# Altium integrated library Samtec 2,54 mm Pitch Socket Strips.IntLib: 489 symbols (part 3 of 4)
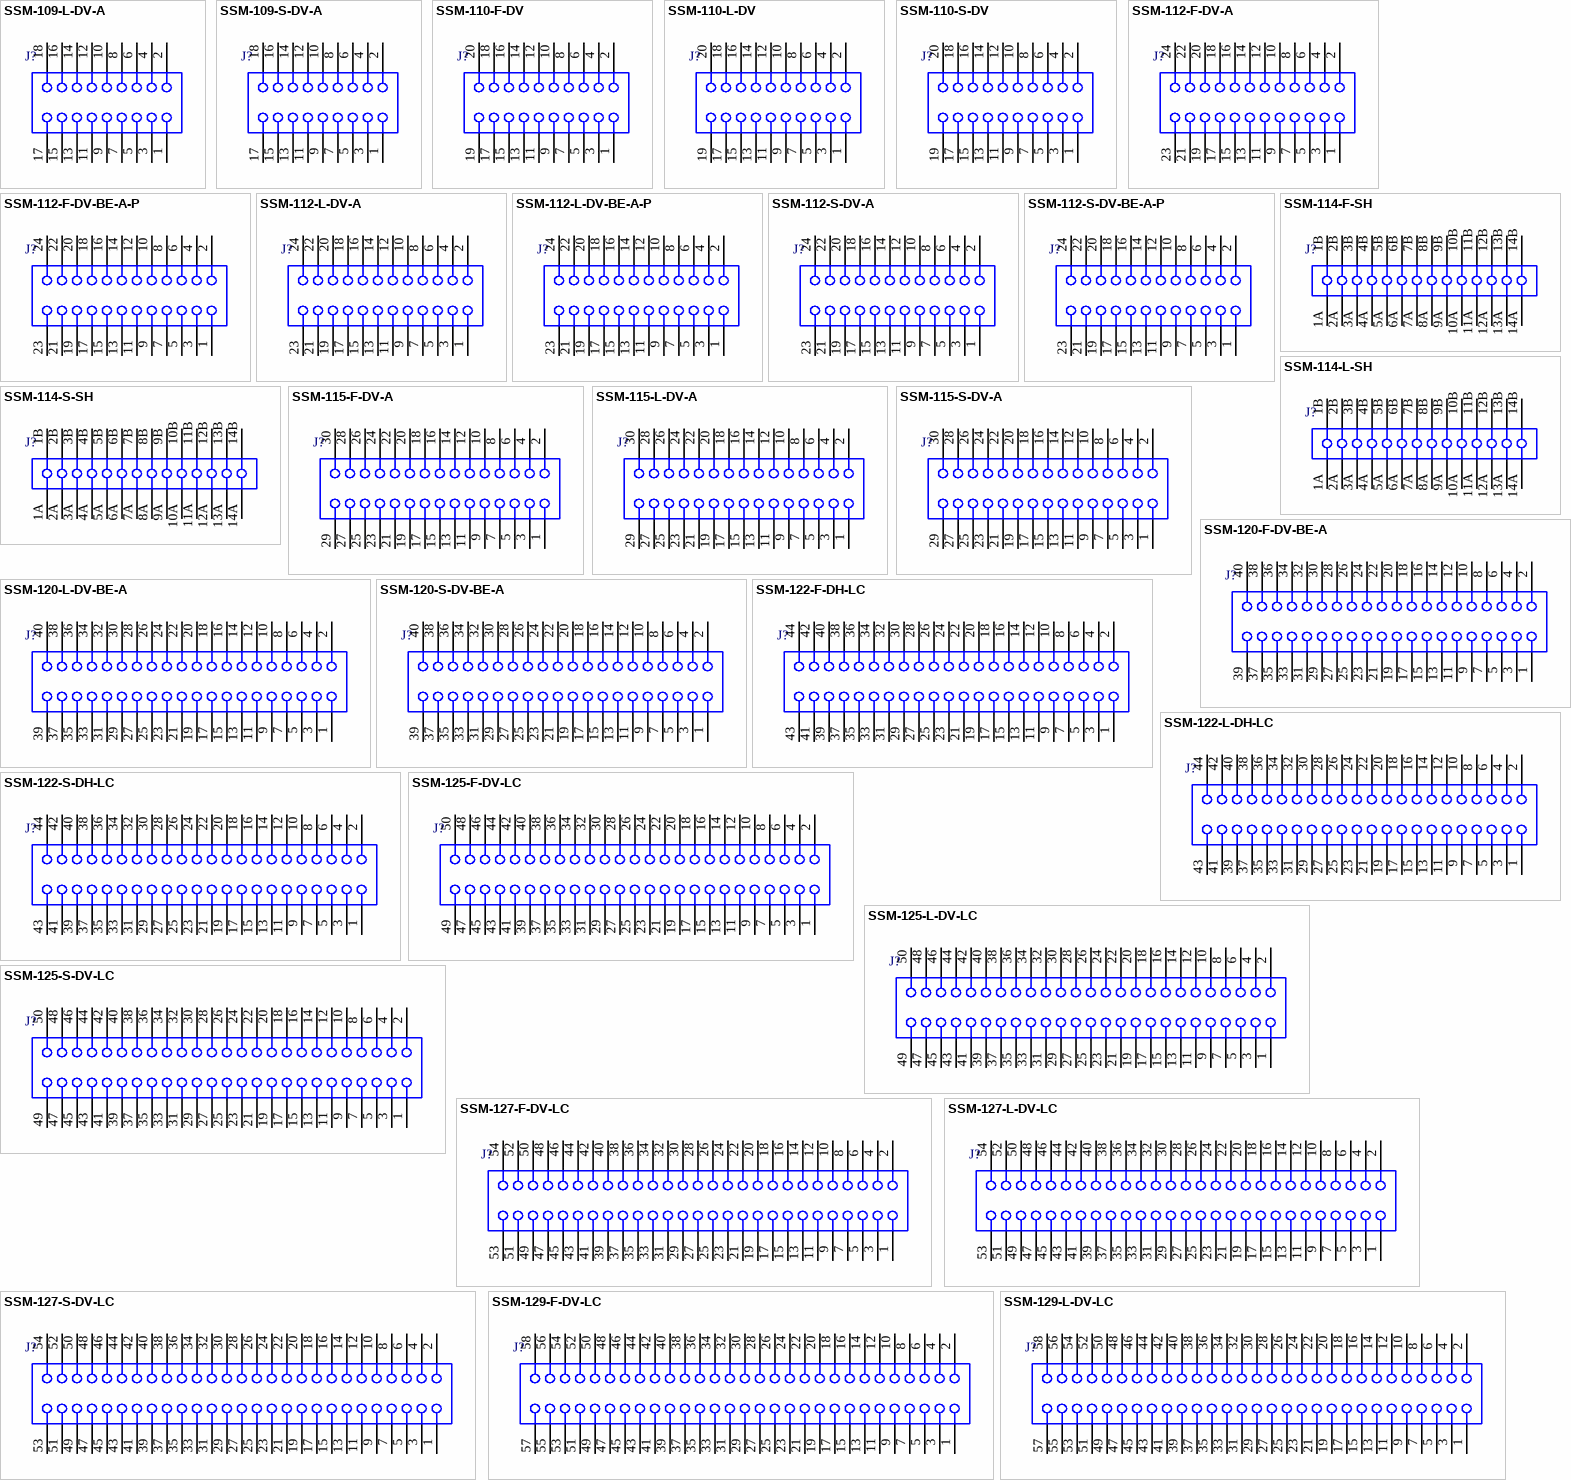
[diagram p15: symbols SSM-109-L-DV-A to SSM-129-L-DV-LC]

## SSM-129-F-DV-LC
designator J?
Tiger Claw(TM) Surface Mount Socket, Vertical, -55 to 125 degC, 2.54 mm Pitch, 58-Pin, Female, RoHS; Manufacturer: Samtec; PartNumber: SSM-129-F-DV-LC; Pitch: 2.54 mm; DatasheetVersion: F-214; PackageVersion: AK, 3/2000; PackageReference: SSM-129-X-DV-LC; PackageDescription: .100 C.L. Double Vertical SMT Socket Strip; Orientation: Vertical; RoHS: True; Temperature Range: -55 to 125 degC; Mounting Technology: Surface Mount; ComponentLink1Description: Manufacturer URL; ComponentLink1URL: http://www.samtec.com; ComponentLink2Description: Datasheet; ComponentLink2URL: http://www.samtec.com/documents/webfiles/pdf/SSM_SM.PDF; ComponentLink3Description: Package Specification; ComponentLink3URL: http://www.samtec.com/documents/webfiles/cpdf/SSM-1XX-XXX-DV-XX-XX-X-XX-MKT.pdf
footprint SMTC-SSM-129-X-DV-LC (C.L. Double Vertical SMT Socket Strip, 2x29 Pins, 2.54mm Pitch, Female)
pins: 1, 2, 3, 4, 5, 6, 7, 8, 9, 10, 11, 12, 13, 14, 15, 16, 17, 18, 19, 20, 21, 22, 23, 24, 25, 26, 27, 28, 29, 30, 31, 32, 33, 34, 35, 36, 37, 38, 39, 40, 41, 42, 43, 44, 45, 46, 47, 48, 49, 50, 51, 52, 53, 54, 55, 56, 57, 58

## SSM-129-L-DV-LC
designator J?
Tiger Claw(TM) Surface Mount Socket, Vertical, -55 to 125 degC, 2.54 mm Pitch, 58-Pin, Female, RoHS; Manufacturer: Samtec; PartNumber: SSM-129-L-DV-LC; Pitch: 2.54 mm; DatasheetVersion: F-214; PackageVersion: AK, 3/2000; PackageReference: SSM-129-X-DV-LC; PackageDescription: .100 C.L. Double Vertical SMT Socket Strip; Orientation: Vertical; RoHS: True; Temperature Range: -55 to 125 degC; Mounting Technology: Surface Mount; ComponentLink1Description: Manufacturer URL; ComponentLink1URL: http://www.samtec.com; ComponentLink2Description: Datasheet; ComponentLink2URL: http://www.samtec.com/documents/webfiles/pdf/SSM_SM.PDF; ComponentLink3Description: Package Specification; ComponentLink3URL: http://www.samtec.com/documents/webfiles/cpdf/SSM-1XX-XXX-DV-XX-XX-X-XX-MKT.pdf
footprint SMTC-SSM-129-X-DV-LC (C.L. Double Vertical SMT Socket Strip, 2x29 Pins, 2.54mm Pitch, Female)
pins: 1, 2, 3, 4, 5, 6, 7, 8, 9, 10, 11, 12, 13, 14, 15, 16, 17, 18, 19, 20, 21, 22, 23, 24, 25, 26, 27, 28, 29, 30, 31, 32, 33, 34, 35, 36, 37, 38, 39, 40, 41, 42, 43, 44, 45, 46, 47, 48, 49, 50, 51, 52, 53, 54, 55, 56, 57, 58

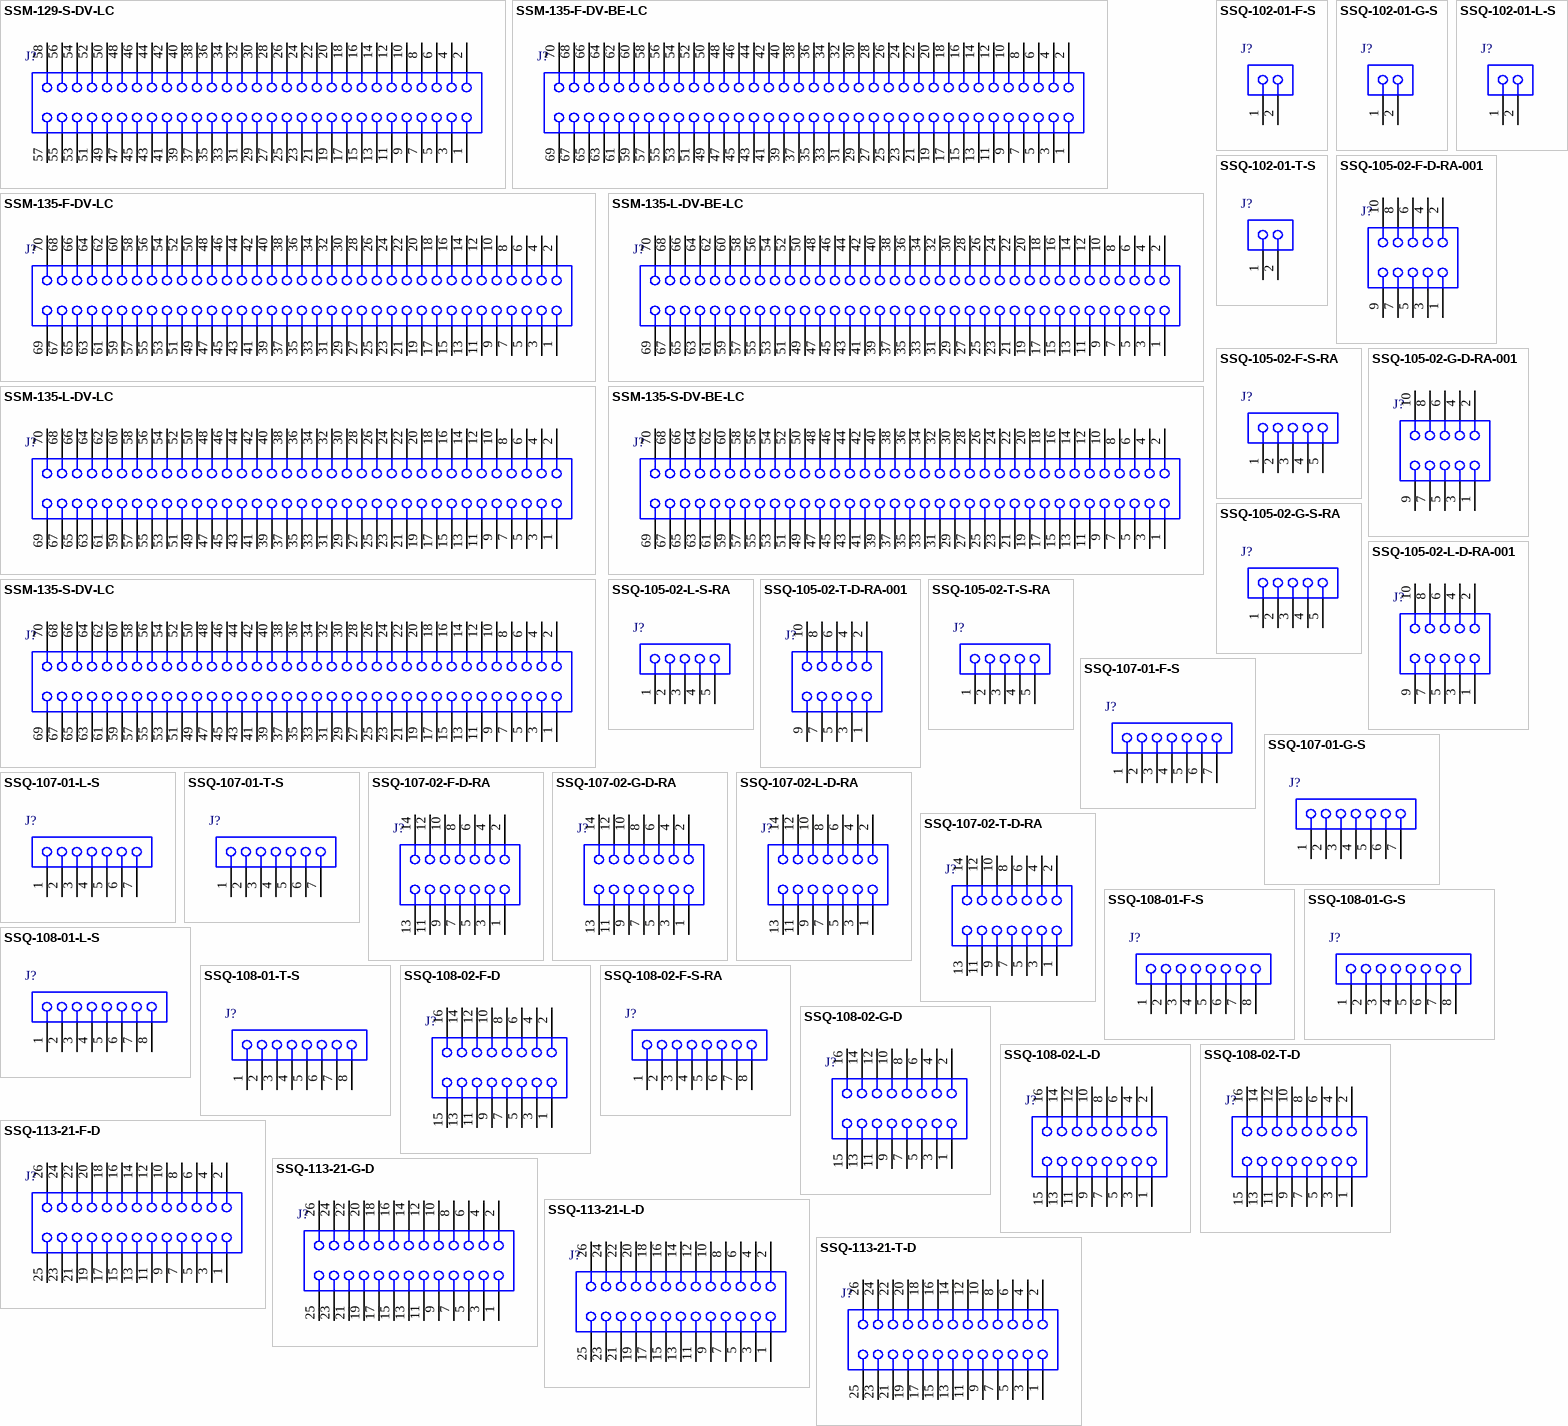
[diagram p7: symbols SSM-129-S-DV-LC to SSQ-113-21-T-D]

## SSM-129-S-DV-LC
designator J?
Tiger Claw(TM) Surface Mount Socket, Vertical, -55 to 125 degC, 2.54 mm Pitch, 58-Pin, Female, RoHS; Manufacturer: Samtec; PartNumber: SSM-129-S-DV-LC; Pitch: 2.54 mm; DatasheetVersion: F-214; PackageVersion: AK, 3/2000; PackageReference: SSM-129-X-DV-LC; PackageDescription: .100 C.L. Double Vertical SMT Socket Strip; Orientation: Vertical; RoHS: True; Temperature Range: -55 to 125 degC; Mounting Technology: Surface Mount; ComponentLink1Description: Manufacturer URL; ComponentLink1URL: http://www.samtec.com; ComponentLink2Description: Datasheet; ComponentLink2URL: http://www.samtec.com/documents/webfiles/pdf/SSM_SM.PDF; ComponentLink3Description: Package Specification; ComponentLink3URL: http://www.samtec.com/documents/webfiles/cpdf/SSM-1XX-XXX-DV-XX-XX-X-XX-MKT.pdf
footprint SMTC-SSM-129-X-DV-LC (C.L. Double Vertical SMT Socket Strip, 2x29 Pins, 2.54mm Pitch, Female)
pins: 1, 2, 3, 4, 5, 6, 7, 8, 9, 10, 11, 12, 13, 14, 15, 16, 17, 18, 19, 20, 21, 22, 23, 24, 25, 26, 27, 28, 29, 30, 31, 32, 33, 34, 35, 36, 37, 38, 39, 40, 41, 42, 43, 44, 45, 46, 47, 48, 49, 50, 51, 52, 53, 54, 55, 56, 57, 58

## SSM-135-F-DV-BE-LC
designator J?
Tiger Claw(TM) Surface Mount Socket, Vertical, -55 to 125 degC, 2.54 mm Pitch, 70-Pin, Female, RoHS; Manufacturer: Samtec; PartNumber: SSM-135-F-DV-BE-LC; Pitch: 2.54 mm; DatasheetVersion: F-214; PackageVersion: AK, 3/2000; PackageReference: SSM-135-X-DV-BE-LC; PackageDescription: .100 C.L. Double Vertical SMT Socket Strip; Orientation: Vertical; RoHS: True; Temperature Range: -55 to 125 degC; Mounting Technology: Surface Mount; ComponentLink1Description: Manufacturer URL; ComponentLink1URL: http://www.samtec.com; ComponentLink2Description: Datasheet; ComponentLink2URL: http://www.samtec.com/documents/webfiles/pdf/SSM_SM.PDF; ComponentLink3Description: Package Specification; ComponentLink3URL: http://www.samtec.com/documents/webfiles/cpdf/SSM-1XX-XXX-DV-XX-XX-X-XX-MKT.pdf
footprint SMTC-SSM-135-X-DV-BE-LC (C.L. Double Vertical SMT Socket Strip, 2x35 Pins, 2.54mm Pitch, Female)
pins: 1, 2, 3, 4, 5, 6, 7, 8, 9, 10, 11, 12, 13, 14, 15, 16, 17, 18, 19, 20, 21, 22, 23, 24, 25, 26, 27, 28, 29, 30, 31, 32, 33, 34, 35, 36, 37, 38, 39, 40, 41, 42, 43, 44, 45, 46, 47, 48, 49, 50, 51, 52, 53, 54, 55, 56, 57, 58, 59, 60, 61, 62, 63, 64, 65, 66, 67, 68, 69, 70

## SSM-135-F-DV-LC
designator J?
Tiger Claw(TM) Surface Mount Socket, Vertical, -55 to 125 degC, 2.54 mm Pitch, 70-Pin, Female, RoHS; Manufacturer: Samtec; PartNumber: SSM-135-F-DV-LC; Pitch: 2.54 mm; DatasheetVersion: F-214; PackageVersion: AK, 3/2000; PackageReference: SSM-135-X-DV-LC; PackageDescription: .100 C.L. Double Vertical SMT Socket Strip; Orientation: Vertical; RoHS: True; Temperature Range: -55 to 125 degC; Mounting Technology: Surface Mount; ComponentLink1Description: Manufacturer URL; ComponentLink1URL: http://www.samtec.com; ComponentLink2Description: Datasheet; ComponentLink2URL: http://www.samtec.com/documents/webfiles/pdf/SSM_SM.PDF; ComponentLink3Description: Package Specification; ComponentLink3URL: http://www.samtec.com/documents/webfiles/cpdf/SSM-1XX-XXX-DV-XX-XX-X-XX-MKT.pdf
footprint SMTC-SSM-135-X-DV-LC (C.L. Double Vertical SMT Socket Strip, 2x35 Pins, 2.54mm Pitch, Female)
pins: 1, 2, 3, 4, 5, 6, 7, 8, 9, 10, 11, 12, 13, 14, 15, 16, 17, 18, 19, 20, 21, 22, 23, 24, 25, 26, 27, 28, 29, 30, 31, 32, 33, 34, 35, 36, 37, 38, 39, 40, 41, 42, 43, 44, 45, 46, 47, 48, 49, 50, 51, 52, 53, 54, 55, 56, 57, 58, 59, 60, 61, 62, 63, 64, 65, 66, 67, 68, 69, 70

## SSM-135-L-DV-BE-LC
designator J?
Tiger Claw(TM) Surface Mount Socket, Vertical, -55 to 125 degC, 2.54 mm Pitch, 70-Pin, Female, RoHS; Manufacturer: Samtec; PartNumber: SSM-135-L-DV-BE-LC; Pitch: 2.54 mm; DatasheetVersion: F-214; PackageVersion: AK, 3/2000; PackageReference: SSM-135-X-DV-BE-LC; PackageDescription: .100 C.L. Double Vertical SMT Socket Strip; Orientation: Vertical; RoHS: True; Temperature Range: -55 to 125 degC; Mounting Technology: Surface Mount; ComponentLink1Description: Manufacturer URL; ComponentLink1URL: http://www.samtec.com; ComponentLink2Description: Datasheet; ComponentLink2URL: http://www.samtec.com/documents/webfiles/pdf/SSM_SM.PDF; ComponentLink3Description: Package Specification; ComponentLink3URL: http://www.samtec.com/documents/webfiles/cpdf/SSM-1XX-XXX-DV-XX-XX-X-XX-MKT.pdf
footprint SMTC-SSM-135-X-DV-BE-LC (C.L. Double Vertical SMT Socket Strip, 2x35 Pins, 2.54mm Pitch, Female)
pins: 1, 2, 3, 4, 5, 6, 7, 8, 9, 10, 11, 12, 13, 14, 15, 16, 17, 18, 19, 20, 21, 22, 23, 24, 25, 26, 27, 28, 29, 30, 31, 32, 33, 34, 35, 36, 37, 38, 39, 40, 41, 42, 43, 44, 45, 46, 47, 48, 49, 50, 51, 52, 53, 54, 55, 56, 57, 58, 59, 60, 61, 62, 63, 64, 65, 66, 67, 68, 69, 70

## SSM-135-L-DV-LC
designator J?
Tiger Claw(TM) Surface Mount Socket, Vertical, -55 to 125 degC, 2.54 mm Pitch, 70-Pin, Female, RoHS; Manufacturer: Samtec; PartNumber: SSM-135-L-DV-LC; Pitch: 2.54 mm; DatasheetVersion: F-214; PackageVersion: AK, 3/2000; PackageReference: SSM-135-X-DV-LC; PackageDescription: .100 C.L. Double Vertical SMT Socket Strip; Orientation: Vertical; RoHS: True; Temperature Range: -55 to 125 degC; Mounting Technology: Surface Mount; ComponentLink1Description: Manufacturer URL; ComponentLink1URL: http://www.samtec.com; ComponentLink2Description: Datasheet; ComponentLink2URL: http://www.samtec.com/documents/webfiles/pdf/SSM_SM.PDF; ComponentLink3Description: Package Specification; ComponentLink3URL: http://www.samtec.com/documents/webfiles/cpdf/SSM-1XX-XXX-DV-XX-XX-X-XX-MKT.pdf
footprint SMTC-SSM-135-X-DV-LC (C.L. Double Vertical SMT Socket Strip, 2x35 Pins, 2.54mm Pitch, Female)
pins: 1, 2, 3, 4, 5, 6, 7, 8, 9, 10, 11, 12, 13, 14, 15, 16, 17, 18, 19, 20, 21, 22, 23, 24, 25, 26, 27, 28, 29, 30, 31, 32, 33, 34, 35, 36, 37, 38, 39, 40, 41, 42, 43, 44, 45, 46, 47, 48, 49, 50, 51, 52, 53, 54, 55, 56, 57, 58, 59, 60, 61, 62, 63, 64, 65, 66, 67, 68, 69, 70

## SSM-135-S-DV-BE-LC
designator J?
Tiger Claw(TM) Surface Mount Socket, Vertical, -55 to 125 degC, 2.54 mm Pitch, 70-Pin, Female, RoHS; Manufacturer: Samtec; PartNumber: SSM-135-S-DV-BE-LC; Pitch: 2.54 mm; DatasheetVersion: F-214; PackageVersion: AK, 3/2000; PackageReference: SSM-135-X-DV-BE-LC; PackageDescription: .100 C.L. Double Vertical SMT Socket Strip; Orientation: Vertical; RoHS: True; Temperature Range: -55 to 125 degC; Mounting Technology: Surface Mount; ComponentLink1Description: Manufacturer URL; ComponentLink1URL: http://www.samtec.com; ComponentLink2Description: Datasheet; ComponentLink2URL: http://www.samtec.com/documents/webfiles/pdf/SSM_SM.PDF; ComponentLink3Description: Package Specification; ComponentLink3URL: http://www.samtec.com/documents/webfiles/cpdf/SSM-1XX-XXX-DV-XX-XX-X-XX-MKT.pdf
footprint SMTC-SSM-135-X-DV-BE-LC (C.L. Double Vertical SMT Socket Strip, 2x35 Pins, 2.54mm Pitch, Female)
pins: 1, 2, 3, 4, 5, 6, 7, 8, 9, 10, 11, 12, 13, 14, 15, 16, 17, 18, 19, 20, 21, 22, 23, 24, 25, 26, 27, 28, 29, 30, 31, 32, 33, 34, 35, 36, 37, 38, 39, 40, 41, 42, 43, 44, 45, 46, 47, 48, 49, 50, 51, 52, 53, 54, 55, 56, 57, 58, 59, 60, 61, 62, 63, 64, 65, 66, 67, 68, 69, 70

## SSM-135-S-DV-LC
designator J?
Tiger Claw(TM) Surface Mount Socket, Vertical, -55 to 125 degC, 2.54 mm Pitch, 70-Pin, Female, RoHS; Manufacturer: Samtec; PartNumber: SSM-135-S-DV-LC; Pitch: 2.54 mm; DatasheetVersion: F-214; PackageVersion: AK, 3/2000; PackageReference: SSM-135-X-DV-LC; PackageDescription: .100 C.L. Double Vertical SMT Socket Strip; Orientation: Vertical; RoHS: True; Temperature Range: -55 to 125 degC; Mounting Technology: Surface Mount; ComponentLink1Description: Manufacturer URL; ComponentLink1URL: http://www.samtec.com; ComponentLink2Description: Datasheet; ComponentLink2URL: http://www.samtec.com/documents/webfiles/pdf/SSM_SM.PDF; ComponentLink3Description: Package Specification; ComponentLink3URL: http://www.samtec.com/documents/webfiles/cpdf/SSM-1XX-XXX-DV-XX-XX-X-XX-MKT.pdf
footprint SMTC-SSM-135-X-DV-LC (C.L. Double Vertical SMT Socket Strip, 2x35 Pins, 2.54mm Pitch, Female)
pins: 1, 2, 3, 4, 5, 6, 7, 8, 9, 10, 11, 12, 13, 14, 15, 16, 17, 18, 19, 20, 21, 22, 23, 24, 25, 26, 27, 28, 29, 30, 31, 32, 33, 34, 35, 36, 37, 38, 39, 40, 41, 42, 43, 44, 45, 46, 47, 48, 49, 50, 51, 52, 53, 54, 55, 56, 57, 58, 59, 60, 61, 62, 63, 64, 65, 66, 67, 68, 69, 70

## SSQ-102-01-F-S
designator J?
SQ Post Socket, Through-hole, Vertical, -55 to 125 degC, 2.54 mm Pitch, 2-Pin, Female, RoHS; Manufacturer: Samtec; PartNumber: SSQ-102-01-F-S; Pitch: 2.54 mm; DatasheetVersion: F-214; PackageVersion: BD, 6/1987; PackageReference: SSQ-102-01-X-S; PackageDescription: Assembly, Socket Strip .025[0.64] SQ Tail; Supplier 1: Newark; Supplier Part Number 1: 73P4753; Orientation: Vertical; RoHS: True; Temperature Range: -55 to 125 degC; Mounting Technology: Through-hole; ComponentLink1Description: Manufacturer URL; ComponentLink1URL: http://www.samtec.com; ComponentLink2Description: Datasheet; ComponentLink2URL: http://www.samtec.com/documents/webfiles/pdf/SSQ_TH.PDF; ComponentLink3Description: Package Specification; ComponentLink3URL: http://www.samtec.com/documents/webfiles/cpdf/SSQ-1XX-XX-XXX-X-XX-XXX-XX-X-MKT.pdf
footprint SMTC-SSQ-102-01-X-S (SQ Post Socket, 1x2 Pins, Vertical, 2.54mm Pitch, Female)
pins: 1, 2

## SSQ-102-01-G-S
designator J?
SQ Post Socket, Through-hole, Vertical, -55 to 125 degC, 2.54 mm Pitch, 2-Pin, Female, RoHS; Manufacturer: Samtec; PartNumber: SSQ-102-01-G-S; Pitch: 2.54 mm; DatasheetVersion: F-214; PackageVersion: BD, 6/1987; PackageReference: SSQ-102-01-X-S; PackageDescription: Assembly, Socket Strip .025[0.64] SQ Tail; Supplier 1: Digi-Key; Supplier Part Number 1: SAM1180-02-ND; Supplier 2: Farnell; Supplier Part Number 2: 1668288; Supplier 3: Newark; Supplier Part Number 3: 15P2829; Supplier 4: Newark; Supplier Part Number 4: 11P8135; Orientation: Vertical; RoHS: True; Temperature Range: -55 to 125 degC; Mounting Technology: Through-hole; ComponentLink1Description: Manufacturer URL; ComponentLink1URL: http://www.samtec.com; ComponentLink2Description: Datasheet; ComponentLink2URL: http://www.samtec.com/documents/webfiles/pdf/SSQ_TH.PDF; ComponentLink3Description: Package Specification; ComponentLink3URL: http://www.samtec.com/documents/webfiles/cpdf/SSQ-1XX-XX-XXX-X-XX-XXX-XX-X-MKT.pdf
footprint SMTC-SSQ-102-01-X-S (SQ Post Socket, 1x2 Pins, Vertical, 2.54mm Pitch, Female)
pins: 1, 2

## SSQ-102-01-L-S
designator J?
SQ Post Socket, Through-hole, Vertical, -55 to 125 degC, 2.54 mm Pitch, 2-Pin, Female, RoHS; Manufacturer: Samtec; PartNumber: SSQ-102-01-L-S; Pitch: 2.54 mm; DatasheetVersion: F-214; PackageVersion: BD, 6/1987; PackageReference: SSQ-102-01-X-S; PackageDescription: Assembly, Socket Strip .025[0.64] SQ Tail; Orientation: Vertical; RoHS: True; Temperature Range: -55 to 125 degC; Mounting Technology: Through-hole; ComponentLink1Description: Manufacturer URL; ComponentLink1URL: http://www.samtec.com; ComponentLink2Description: Datasheet; ComponentLink2URL: http://www.samtec.com/documents/webfiles/pdf/SSQ_TH.PDF; ComponentLink3Description: Package Specification; ComponentLink3URL: http://www.samtec.com/documents/webfiles/cpdf/SSQ-1XX-XX-XXX-X-XX-XXX-XX-X-MKT.pdf
footprint SMTC-SSQ-102-01-X-S (SQ Post Socket, 1x2 Pins, Vertical, 2.54mm Pitch, Female)
pins: 1, 2

## SSQ-102-01-T-S
designator J?
SQ Post Socket, Through-hole, Vertical, -55 to 105 degC, 2.54 mm Pitch, 2-Pin, Female, RoHS; Manufacturer: Samtec; PartNumber: SSQ-102-01-T-S; Pitch: 2.54 mm; DatasheetVersion: F-214; PackageVersion: BD, 6/1987; PackageReference: SSQ-102-01-X-S; PackageDescription: Assembly, Socket Strip .025[0.64] SQ Tail; Supplier 1: Digi-Key; Supplier Part Number 1: SAM1184-02-ND; Supplier 2: Newark; Supplier Part Number 2: 11P8139; Orientation: Vertical; RoHS: True; Temperature Range: -55 to 105 degC; Mounting Technology: Through-hole; ComponentLink1Description: Manufacturer URL; ComponentLink1URL: http://www.samtec.com; ComponentLink2Description: Datasheet; ComponentLink2URL: http://www.samtec.com/documents/webfiles/pdf/SSQ_TH.PDF; ComponentLink3Description: Package Specification; ComponentLink3URL: http://www.samtec.com/documents/webfiles/cpdf/SSQ-1XX-XX-XXX-X-XX-XXX-XX-X-MKT.pdf
footprint SMTC-SSQ-102-01-X-S (SQ Post Socket, 1x2 Pins, Vertical, 2.54mm Pitch, Female)
pins: 1, 2

## SSQ-105-02-F-D-RA-001
designator J?
SQ Post Socket, Through-hole, Right Angle, -55 to 125 degC, 2.54 mm Pitch, 10-Pin, Female, RoHS; Manufacturer: Samtec; PartNumber: SSQ-105-02-F-D-RA-001; Pitch: 2.54 mm; DatasheetVersion: F-214; PackageVersion: BD, 6/1987; PackageReference: SSQ-105-02-X-D-RA-001; PackageDescription: Assembly, Socket Strip .025[0.64] SQ Tail; Orientation: Right Angle; RoHS: True; Temperature Range: -55 to 125 degC; Mounting Technology: Through-hole; ComponentLink1Description: Manufacturer URL; ComponentLink1URL: http://www.samtec.com; ComponentLink2Description: Datasheet; ComponentLink2URL: http://www.samtec.com/documents/webfiles/pdf/SSQ_TH.PDF; ComponentLink3Description: Package Specification; ComponentLink3URL: http://www.samtec.com/documents/webfiles/cpdf/SSQ-1XX-XX-XXX-X-XX-XXX-XX-X-MKT.pdf
footprint SMTC-SSQ-105-02-X-D-RA-001 (SQ Post Socket, 2x5 Pins, Right Angle, 2.54mm Pitch, Female)
pins: 1, 2, 3, 4, 5, 6, 7, 8, 9, 10

## SSQ-105-02-F-S-RA
designator J?
SQ Post Socket, Through-hole, Right Angle, -55 to 125 degC, 2.54 mm Pitch, 5-Pin, Female, RoHS; Manufacturer: Samtec; PartNumber: SSQ-105-02-F-S-RA; Pitch: 2.54 mm; DatasheetVersion: F-214; PackageVersion: BD, 6/1987; PackageReference: SSQ-105-02-X-S-RA; PackageDescription: Assembly, Socket Strip .025[0.64] SQ Tail; Supplier 1: Newark; Supplier Part Number 1: 81P8072; Orientation: Right Angle; RoHS: True; Temperature Range: -55 to 125 degC; Mounting Technology: Through-hole; ComponentLink1Description: Manufacturer URL; ComponentLink1URL: http://www.samtec.com; ComponentLink2Description: Datasheet; ComponentLink2URL: http://www.samtec.com/documents/webfiles/pdf/SSQ_TH.PDF; ComponentLink3Description: Package Specification; ComponentLink3URL: http://www.samtec.com/documents/webfiles/cpdf/SSQ-1XX-XX-XXX-X-XX-XXX-XX-X-MKT.pdf
footprint SMTC-SSQ-105-02-X-S-RA (SQ Post Socket, 1x5 Pins, Right Angle, 2.54mm Pitch, Female)
pins: 1, 2, 3, 4, 5

## SSQ-105-02-G-D-RA-001
designator J?
SQ Post Socket, Through-hole, Right Angle, -55 to 125 degC, 2.54 mm Pitch, 10-Pin, Female, RoHS; Manufacturer: Samtec; PartNumber: SSQ-105-02-G-D-RA-001; Pitch: 2.54 mm; DatasheetVersion: F-214; PackageVersion: BD, 6/1987; PackageReference: SSQ-105-02-X-D-RA-001; PackageDescription: Assembly, Socket Strip .025[0.64] SQ Tail; Orientation: Right Angle; RoHS: True; Temperature Range: -55 to 125 degC; Mounting Technology: Through-hole; ComponentLink1Description: Manufacturer URL; ComponentLink1URL: http://www.samtec.com; ComponentLink2Description: Datasheet; ComponentLink2URL: http://www.samtec.com/documents/webfiles/pdf/SSQ_TH.PDF; ComponentLink3Description: Package Specification; ComponentLink3URL: http://www.samtec.com/documents/webfiles/cpdf/SSQ-1XX-XX-XXX-X-XX-XXX-XX-X-MKT.pdf
footprint SMTC-SSQ-105-02-X-D-RA-001 (SQ Post Socket, 2x5 Pins, Right Angle, 2.54mm Pitch, Female)
pins: 1, 2, 3, 4, 5, 6, 7, 8, 9, 10

## SSQ-105-02-G-S-RA
designator J?
SQ Post Socket, Through-hole, Right Angle, -55 to 125 degC, 2.54 mm Pitch, 5-Pin, Female, RoHS; Manufacturer: Samtec; PartNumber: SSQ-105-02-G-S-RA; Pitch: 2.54 mm; DatasheetVersion: F-214; PackageVersion: BD, 6/1987; PackageReference: SSQ-105-02-X-S-RA; PackageDescription: Assembly, Socket Strip .025[0.64] SQ Tail; Supplier 1: Digi-Key; Supplier Part Number 1: SAM1188-05-ND; Supplier 2: Newark; Supplier Part Number 2: 11P8230; Orientation: Right Angle; RoHS: True; Temperature Range: -55 to 125 degC; Mounting Technology: Through-hole; ComponentLink1Description: Manufacturer URL; ComponentLink1URL: http://www.samtec.com; ComponentLink2Description: Datasheet; ComponentLink2URL: http://www.samtec.com/documents/webfiles/pdf/SSQ_TH.PDF; ComponentLink3Description: Package Specification; ComponentLink3URL: http://www.samtec.com/documents/webfiles/cpdf/SSQ-1XX-XX-XXX-X-XX-XXX-XX-X-MKT.pdf
footprint SMTC-SSQ-105-02-X-S-RA (SQ Post Socket, 1x5 Pins, Right Angle, 2.54mm Pitch, Female)
pins: 1, 2, 3, 4, 5

## SSQ-105-02-L-D-RA-001
designator J?
SQ Post Socket, Through-hole, Right Angle, -55 to 125 degC, 2.54 mm Pitch, 10-Pin, Female, RoHS; Manufacturer: Samtec; PartNumber: SSQ-105-02-L-D-RA-001; Pitch: 2.54 mm; DatasheetVersion: F-214; PackageVersion: BD, 6/1987; PackageReference: SSQ-105-02-X-D-RA-001; PackageDescription: Assembly, Socket Strip .025[0.64] SQ Tail; Orientation: Right Angle; RoHS: True; Temperature Range: -55 to 125 degC; Mounting Technology: Through-hole; ComponentLink1Description: Manufacturer URL; ComponentLink1URL: http://www.samtec.com; ComponentLink2Description: Datasheet; ComponentLink2URL: http://www.samtec.com/documents/webfiles/pdf/SSQ_TH.PDF; ComponentLink3Description: Package Specification; ComponentLink3URL: http://www.samtec.com/documents/webfiles/cpdf/SSQ-1XX-XX-XXX-X-XX-XXX-XX-X-MKT.pdf
footprint SMTC-SSQ-105-02-X-D-RA-001 (SQ Post Socket, 2x5 Pins, Right Angle, 2.54mm Pitch, Female)
pins: 1, 2, 3, 4, 5, 6, 7, 8, 9, 10

## SSQ-105-02-L-S-RA
designator J?
SQ Post Socket, Through-hole, Right Angle, -55 to 125 degC, 2.54 mm Pitch, 5-Pin, Female, RoHS; Manufacturer: Samtec; PartNumber: SSQ-105-02-L-S-RA; Pitch: 2.54 mm; DatasheetVersion: F-214; PackageVersion: BD, 6/1987; PackageReference: SSQ-105-02-X-S-RA; PackageDescription: Assembly, Socket Strip .025[0.64] SQ Tail; Orientation: Right Angle; RoHS: True; Temperature Range: -55 to 125 degC; Mounting Technology: Through-hole; ComponentLink1Description: Manufacturer URL; ComponentLink1URL: http://www.samtec.com; ComponentLink2Description: Datasheet; ComponentLink2URL: http://www.samtec.com/documents/webfiles/pdf/SSQ_TH.PDF; ComponentLink3Description: Package Specification; ComponentLink3URL: http://www.samtec.com/documents/webfiles/cpdf/SSQ-1XX-XX-XXX-X-XX-XXX-XX-X-MKT.pdf
footprint SMTC-SSQ-105-02-X-S-RA (SQ Post Socket, 1x5 Pins, Right Angle, 2.54mm Pitch, Female)
pins: 1, 2, 3, 4, 5

## SSQ-105-02-T-D-RA-001
designator J?
SQ Post Socket, Through-hole, Right Angle, -55 to 105 degC, 2.54 mm Pitch, 10-Pin, Female, RoHS; Manufacturer: Samtec; PartNumber: SSQ-105-02-T-D-RA-001; Pitch: 2.54 mm; DatasheetVersion: F-214; PackageVersion: BD, 6/1987; PackageReference: SSQ-105-02-X-D-RA-001; PackageDescription: Assembly, Socket Strip .025[0.64] SQ Tail; Orientation: Right Angle; RoHS: True; Temperature Range: -55 to 105 degC; Mounting Technology: Through-hole; ComponentLink1Description: Manufacturer URL; ComponentLink1URL: http://www.samtec.com; ComponentLink2Description: Datasheet; ComponentLink2URL: http://www.samtec.com/documents/webfiles/pdf/SSQ_TH.PDF; ComponentLink3Description: Package Specification; ComponentLink3URL: http://www.samtec.com/documents/webfiles/cpdf/SSQ-1XX-XX-XXX-X-XX-XXX-XX-X-MKT.pdf
footprint SMTC-SSQ-105-02-X-D-RA-001 (SQ Post Socket, 2x5 Pins, Right Angle, 2.54mm Pitch, Female)
pins: 1, 2, 3, 4, 5, 6, 7, 8, 9, 10

## SSQ-105-02-T-S-RA
designator J?
SQ Post Socket, Through-hole, Right Angle, -55 to 105 degC, 2.54 mm Pitch, 5-Pin, Female, RoHS; Manufacturer: Samtec; PartNumber: SSQ-105-02-T-S-RA; Pitch: 2.54 mm; DatasheetVersion: F-214; PackageVersion: BD, 6/1987; PackageReference: SSQ-105-02-X-S-RA; PackageDescription: Assembly, Socket Strip .025[0.64] SQ Tail; Supplier 1: Digi-Key; Supplier Part Number 1: SAM1195-05-ND; Orientation: Right Angle; RoHS: True; Temperature Range: -55 to 105 degC; Mounting Technology: Through-hole; ComponentLink1Description: Manufacturer URL; ComponentLink1URL: http://www.samtec.com; ComponentLink2Description: Datasheet; ComponentLink2URL: http://www.samtec.com/documents/webfiles/pdf/SSQ_TH.PDF; ComponentLink3Description: Package Specification; ComponentLink3URL: http://www.samtec.com/documents/webfiles/cpdf/SSQ-1XX-XX-XXX-X-XX-XXX-XX-X-MKT.pdf
footprint SMTC-SSQ-105-02-X-S-RA (SQ Post Socket, 1x5 Pins, Right Angle, 2.54mm Pitch, Female)
pins: 1, 2, 3, 4, 5

## SSQ-107-01-F-S
designator J?
SQ Post Socket, Through-hole, Vertical, -55 to 125 degC, 2.54 mm Pitch, 7-Pin, Female, RoHS; Manufacturer: Samtec; PartNumber: SSQ-107-01-F-S; Pitch: 2.54 mm; DatasheetVersion: F-214; PackageVersion: BD, 6/1987; PackageReference: SSQ-107-01-X-S; PackageDescription: Assembly, Socket Strip .025[0.64] SQ Tail; Supplier 1: Newark; Supplier Part Number 1: 81P8369; Orientation: Vertical; RoHS: True; Temperature Range: -55 to 125 degC; Mounting Technology: Through-hole; ComponentLink1Description: Manufacturer URL; ComponentLink1URL: http://www.samtec.com; ComponentLink2Description: Datasheet; ComponentLink2URL: http://www.samtec.com/documents/webfiles/pdf/SSQ_TH.PDF; ComponentLink3Description: Package Specification; ComponentLink3URL: http://www.samtec.com/documents/webfiles/cpdf/SSQ-1XX-XX-XXX-X-XX-XXX-XX-X-MKT.pdf
footprint SMTC-SSQ-107-01-X-S (SQ Post Socket, 1x7 Pins, Vertical, 2.54mm Pitch, Female)
pins: 1, 2, 3, 4, 5, 6, 7

## SSQ-107-01-G-S
designator J?
SQ Post Socket, Through-hole, Vertical, -55 to 125 degC, 2.54 mm Pitch, 7-Pin, Female, RoHS; Manufacturer: Samtec; PartNumber: SSQ-107-01-G-S; Pitch: 2.54 mm; DatasheetVersion: F-214; PackageVersion: BD, 6/1987; PackageReference: SSQ-107-01-X-S; PackageDescription: Assembly, Socket Strip .025[0.64] SQ Tail; Supplier 1: Digi-Key; Supplier Part Number 1: SAM1180-07-ND; Orientation: Vertical; RoHS: True; Temperature Range: -55 to 125 degC; Mounting Technology: Through-hole; ComponentLink1Description: Manufacturer URL; ComponentLink1URL: http://www.samtec.com; ComponentLink2Description: Datasheet; ComponentLink2URL: http://www.samtec.com/documents/webfiles/pdf/SSQ_TH.PDF; ComponentLink3Description: Package Specification; ComponentLink3URL: http://www.samtec.com/documents/webfiles/cpdf/SSQ-1XX-XX-XXX-X-XX-XXX-XX-X-MKT.pdf
footprint SMTC-SSQ-107-01-X-S (SQ Post Socket, 1x7 Pins, Vertical, 2.54mm Pitch, Female)
pins: 1, 2, 3, 4, 5, 6, 7

## SSQ-107-01-L-S
designator J?
SQ Post Socket, Through-hole, Vertical, -55 to 125 degC, 2.54 mm Pitch, 7-Pin, Female, RoHS; Manufacturer: Samtec; PartNumber: SSQ-107-01-L-S; Pitch: 2.54 mm; DatasheetVersion: F-214; PackageVersion: BD, 6/1987; PackageReference: SSQ-107-01-X-S; PackageDescription: Assembly, Socket Strip .025[0.64] SQ Tail; Orientation: Vertical; RoHS: True; Temperature Range: -55 to 125 degC; Mounting Technology: Through-hole; ComponentLink1Description: Manufacturer URL; ComponentLink1URL: http://www.samtec.com; ComponentLink2Description: Datasheet; ComponentLink2URL: http://www.samtec.com/documents/webfiles/pdf/SSQ_TH.PDF; ComponentLink3Description: Package Specification; ComponentLink3URL: http://www.samtec.com/documents/webfiles/cpdf/SSQ-1XX-XX-XXX-X-XX-XXX-XX-X-MKT.pdf
footprint SMTC-SSQ-107-01-X-S (SQ Post Socket, 1x7 Pins, Vertical, 2.54mm Pitch, Female)
pins: 1, 2, 3, 4, 5, 6, 7

## SSQ-107-01-T-S
designator J?
SQ Post Socket, Through-hole, Vertical, -55 to 105 degC, 2.54 mm Pitch, 7-Pin, Female, RoHS; Manufacturer: Samtec; PartNumber: SSQ-107-01-T-S; Pitch: 2.54 mm; DatasheetVersion: F-214; PackageVersion: BD, 6/1987; PackageReference: SSQ-107-01-X-S; PackageDescription: Assembly, Socket Strip .025[0.64] SQ Tail; Supplier 1: Digi-Key; Supplier Part Number 1: SAM1184-07-ND; Supplier 2: Newark; Supplier Part Number 2: 11P8284; Orientation: Vertical; RoHS: True; Temperature Range: -55 to 105 degC; Mounting Technology: Through-hole; ComponentLink1Description: Manufacturer URL; ComponentLink1URL: http://www.samtec.com; ComponentLink2Description: Datasheet; ComponentLink2URL: http://www.samtec.com/documents/webfiles/pdf/SSQ_TH.PDF; ComponentLink3Description: Package Specification; ComponentLink3URL: http://www.samtec.com/documents/webfiles/cpdf/SSQ-1XX-XX-XXX-X-XX-XXX-XX-X-MKT.pdf
footprint SMTC-SSQ-107-01-X-S (SQ Post Socket, 1x7 Pins, Vertical, 2.54mm Pitch, Female)
pins: 1, 2, 3, 4, 5, 6, 7

## SSQ-107-02-F-D-RA
designator J?